# Altium integrated library Wurth Electronik Socket Header 6130xx11821.IntLib: 197 symbols (part 1 of 2) (continued)
## WE-2.54 mm Socket Header 61003221821 (continued)
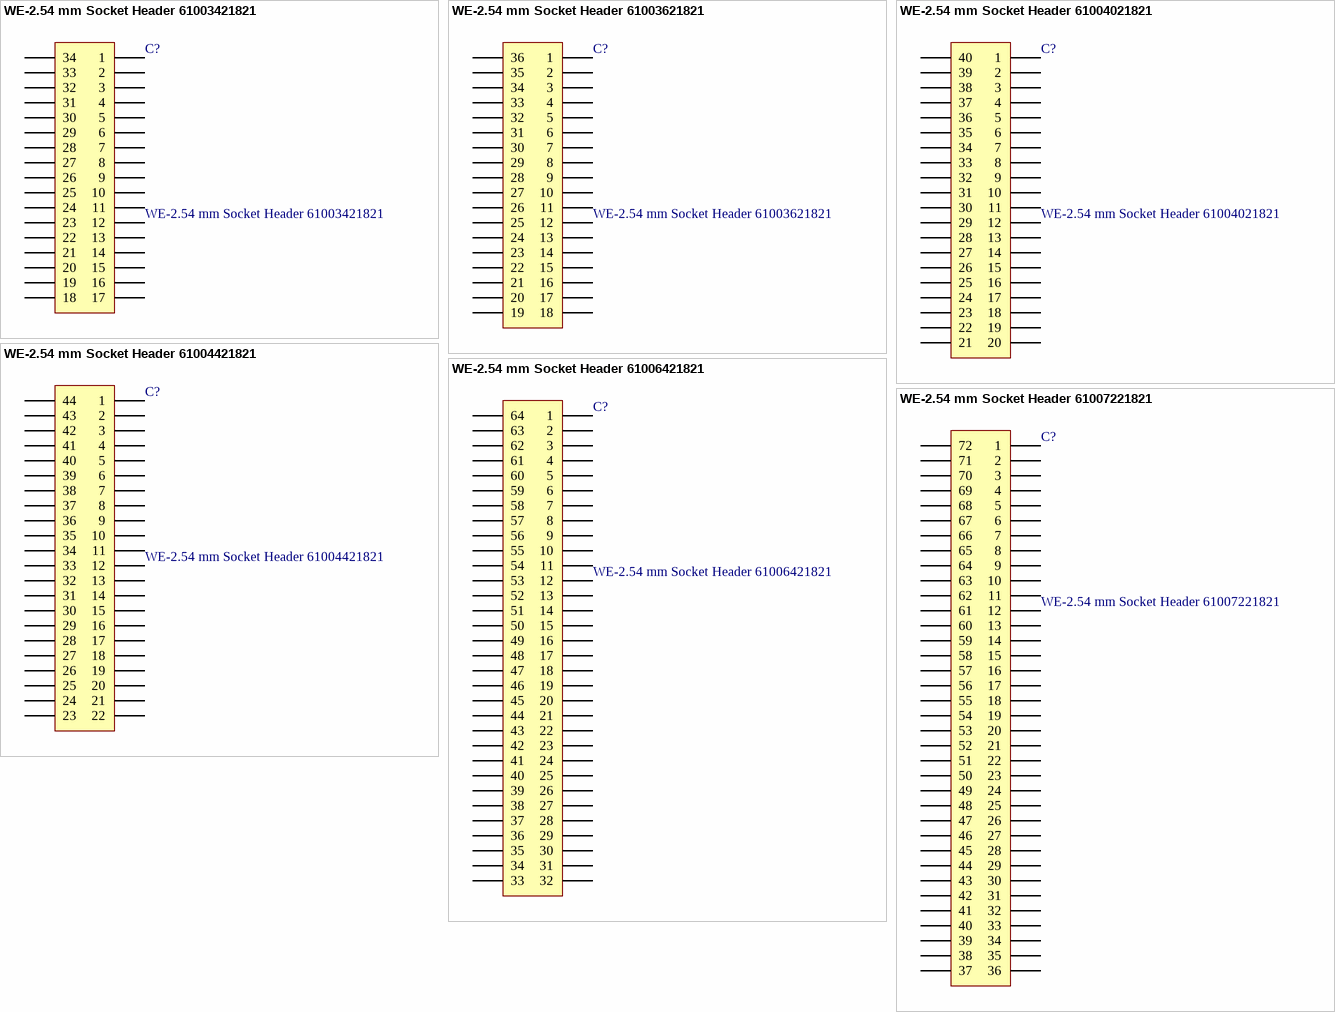
[diagram p2: symbols WE-2.54 mm Socket Header 61003421821 to WE-2.54 mm Socket Header 61007221821]

## WE-2.54 mm Socket Header 61003421821
designator C?
WR-PHD 2.54 mm Dual SMT Socket Header; Manufacturer: Würth Elektronik eiSos GmbH; ComponentLink1 Description: Manufacturer; ComponentLink2 Description: Datasheet; NoPins: 34; Created Date: 29 March 2013; partNo: 61003421821; ComponentLink1URL: http://www.we-online.com; ComponentLink2URL: http://katalog.we-online.de/em/datasheet/6100xx21821.pdf; Created by: Karrer Zheng
footprint 61003421821 (34 pins, dual row, straight, gold plating)
pins: 1, 2, 3, 4, 5, 6, 7, 8, 9, 10, 11, 12, 13, 14, 15, 16, 17, 18, 19, 20, 21, 22, 23, 24, 25, 26, 27, 28, 29, 30, 31, 32, 33, 34

## WE-2.54 mm Socket Header 61003621821
designator C?
WR-PHD 2.54 mm Dual SMT Socket Header; Manufacturer: Würth Elektronik eiSos GmbH; ComponentLink1 Description: Manufacturer; ComponentLink2 Description: Datasheet; NoPins: 36; Created Date: 29 March 2013; partNo: 61003621821; ComponentLink1URL: http://www.we-online.com; ComponentLink2URL: http://katalog.we-online.de/em/datasheet/6100xx21821.pdf; Created by: Karrer Zheng
footprint 61003621821 (36 pins, dual row, straight, gold plating)
pins: 1, 2, 3, 4, 5, 6, 7, 8, 9, 10, 11, 12, 13, 14, 15, 16, 17, 18, 19, 20, 21, 22, 23, 24, 25, 26, 27, 28, 29, 30, 31, 32, 33, 34, 35, 36

## WE-2.54 mm Socket Header 61004021821
designator C?
WR-PHD 2.54 mm Dual SMT Socket Header; Manufacturer: Würth Elektronik eiSos GmbH; ComponentLink1 Description: Manufacturer; ComponentLink2 Description: Datasheet; NoPins: 40; Created Date: 29 March 2013; partNo: 61004021821; ComponentLink1URL: http://www.we-online.com; ComponentLink2URL: http://katalog.we-online.de/em/datasheet/6100xx21821.pdf; Created by: Karrer Zheng
footprint 61004021821 (40 pins, dual row, straight, gold plating)
pins: 1, 2, 3, 4, 5, 6, 7, 8, 9, 10, 11, 12, 13, 14, 15, 16, 17, 18, 19, 20, 21, 22, 23, 24, 25, 26, 27, 28, 29, 30, 31, 32, 33, 34, 35, 36, 37, 38, 39, 40

## WE-2.54 mm Socket Header 61004421821
designator C?
WR-PHD 2.54 mm Dual SMT Socket Header; Manufacturer: Würth Elektronik eiSos GmbH; ComponentLink1 Description: Manufacturer; ComponentLink2 Description: Datasheet; NoPins: 44; Created Date: 29 March 2013; partNo: 61004421821; ComponentLink1URL: http://www.we-online.com; ComponentLink2URL: http://katalog.we-online.de/em/datasheet/6100xx21821.pdf; Created by: Karrer Zheng
footprint 61004421821 (44 pins, dual row, straight, gold plating)
pins: 1, 2, 3, 4, 5, 6, 7, 8, 9, 10, 11, 12, 13, 14, 15, 16, 17, 18, 19, 20, 21, 22, 23, 24, 25, 26, 27, 28, 29, 30, 31, 32, 33, 34, 35, 36, 37, 38, 39, 40, 41, 42, 43, 44

## WE-2.54 mm Socket Header 61006421821
designator C?
WR-PHD 2.54 mm Dual SMT Socket Header; Manufacturer: Würth Elektronik eiSos GmbH; ComponentLink1 Description: Manufacturer; ComponentLink2 Description: Datasheet; NoPins: 64; Created Date: 29 March 2013; partNo: 61006421821; ComponentLink1URL: http://www.we-online.com; ComponentLink2URL: http://katalog.we-online.de/em/datasheet/6100xx21821.pdf; Created by: Karrer Zheng
footprint 61006421821 (64 pins, dual row, straight, gold plating)
pins: 1, 2, 3, 4, 5, 6, 7, 8, 9, 10, 11, 12, 13, 14, 15, 16, 17, 18, 19, 20, 21, 22, 23, 24, 25, 26, 27, 28, 29, 30, 31, 32, 33, 34, 35, 36, 37, 38, 39, 40, 41, 42, 43, 44, 45, 46, 47, 48, 49, 50, 51, 52, 53, 54, 55, 56, 57, 58, 59, 60, 61, 62, 63, 64

## WE-2.54 mm Socket Header 61007221821
designator C?
WR-PHD 2.54 mm Dual SMT Socket Header; Manufacturer: Würth Elektronik eiSos GmbH; ComponentLink1 Description: Manufacturer; ComponentLink2 Description: Datasheet; NoPins: 72; Created Date: 29 March 2013; partNo: 61007221821; ComponentLink1URL: http://www.we-online.com; ComponentLink2URL: http://katalog.we-online.de/em/datasheet/6100xx21821.pdf; Created by: Karrer Zheng
footprint 61007221821 (72 pins, dual row, straight, gold plating)
pins: 1, 2, 3, 4, 5, 6, 7, 8, 9, 10, 11, 12, 13, 14, 15, 16, 17, 18, 19, 20, 21, 22, 23, 24, 25, 26, 27, 28, 29, 30, 31, 32, 33, 34, 35, 36, 37, 38, 39, 40, 41, 42, 43, 44, 45, 46, 47, 48, 49, 50, 51, 52, 53, 54, 55, 56, 57, 58, 59, 60, 61, 62, 63, 64, 65, 66, 67, 68, 69, 70, 71, 72


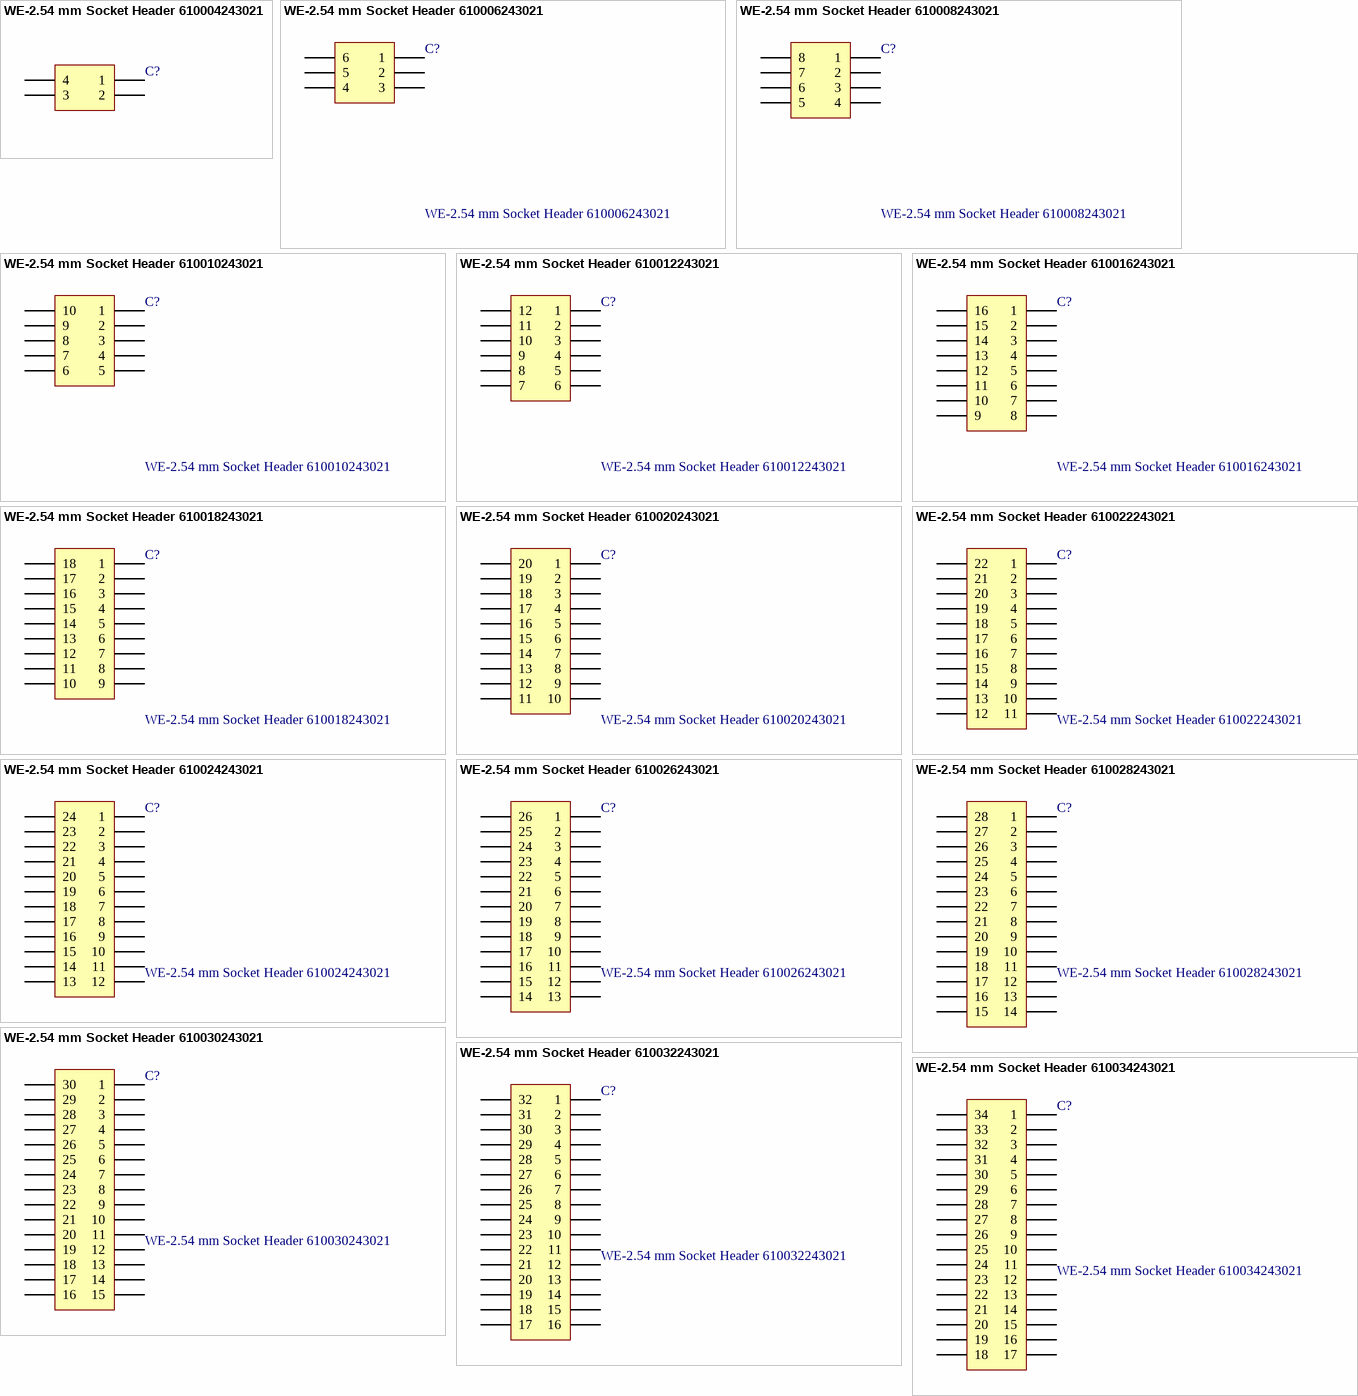
[diagram p3: symbols WE-2.54 mm Socket Header 610004243021 to WE-2.54 mm Socket Header 610034243021]

## WE-2.54 mm Socket Header 610004243021
designator C?
WR-PHD 2.54 mm SMT Dual Socket Header Bottom Entry; Manufacturer: Würth Elektronik eiSos GmbH; ComponentLink1 Description: Manufacturer; ComponentLink2 Description: Datasheet; NoPins: 04; Created Date: 29 March 2013; partNo: 610004243021; ComponentLink1URL: http://www.we-online.com; ComponentLink2URL: http://katalog.we-online.de/em/datasheet/6100xx243021.pdf; Created by: Karrer Zheng
footprint 610004243021 (04p dual row straight 3,7mm height)
pins: 1, 2, 3, 4

## WE-2.54 mm Socket Header 610006243021
designator C?
WR-PHD 2.54 mm SMT Dual Socket Header Bottom Entry; Manufacturer: Würth Elektronik eiSos GmbH; ComponentLink1 Description: Manufacturer; ComponentLink2 Description: Datasheet; NoPins: 06; Created Date: 29 March 2013; partNo: 610006243021; ComponentLink1URL: http://www.we-online.com; ComponentLink2URL: http://katalog.we-online.de/em/datasheet/6100xx243021.pdf; Created by: Karrer Zheng
footprint 610006243021 (06p dual row straight 3,7mm height)
pins: 1, 2, 3, 4, 5, 6

## WE-2.54 mm Socket Header 610008243021
designator C?
WR-PHD 2.54 mm SMT Dual Socket Header Bottom Entry; Manufacturer: Würth Elektronik eiSos GmbH; ComponentLink1 Description: Manufacturer; ComponentLink2 Description: Datasheet; NoPins: 08; Created Date: 29 March 2013; partNo: 610008243021; ComponentLink1URL: http://www.we-online.com; ComponentLink2URL: http://katalog.we-online.de/em/datasheet/6100xx243021.pdf; Created by: Karrer Zheng
footprint 610008243021 (08p dual row straight 3,7mm height)
pins: 1, 2, 3, 4, 5, 6, 7, 8

## WE-2.54 mm Socket Header 610010243021
designator C?
WR-PHD 2.54 mm SMT Dual Socket Header Bottom Entry; Manufacturer: Würth Elektronik eiSos GmbH; ComponentLink1 Description: Manufacturer; ComponentLink2 Description: Datasheet; NoPins: 10; Created Date: 29 March 2013; partNo: 610010243021; ComponentLink1URL: http://www.we-online.com; ComponentLink2URL: http://katalog.we-online.de/em/datasheet/6100xx243021.pdf; Created by: Karrer Zheng
footprint 610010243021 (10p dual row straight 3,7mm height)
pins: 1, 2, 3, 4, 5, 6, 7, 8, 9, 10

## WE-2.54 mm Socket Header 610012243021
designator C?
WR-PHD 2.54 mm SMT Dual Socket Header Bottom Entry; Manufacturer: Würth Elektronik eiSos GmbH; ComponentLink1 Description: Manufacturer; ComponentLink2 Description: Datasheet; NoPins: 12; Created Date: 29 March 2013; partNo: 610012243021; ComponentLink1URL: http://www.we-online.com; ComponentLink2URL: http://katalog.we-online.de/em/datasheet/6100xx243021.pdf; Created by: Karrer Zheng
footprint 610012243021 (12p dual row straight 3,7mm height)
pins: 1, 2, 3, 4, 5, 6, 7, 8, 9, 10, 11, 12

## WE-2.54 mm Socket Header 610016243021
designator C?
WR-PHD 2.54 mm SMT Dual Socket Header Bottom Entry; Manufacturer: Würth Elektronik eiSos GmbH; ComponentLink1 Description: Manufacturer; ComponentLink2 Description: Datasheet; NoPins: 16; Created Date: 29 March 2013; partNo: 610016243021; ComponentLink1URL: http://www.we-online.com; ComponentLink2URL: http://katalog.we-online.de/em/datasheet/6100xx243021.pdf; Created by: Karrer Zheng
footprint 610016243021 (16p dual row straight 3,7mm height)
pins: 1, 2, 3, 4, 5, 6, 7, 8, 9, 10, 11, 12, 13, 14, 15, 16

## WE-2.54 mm Socket Header 610018243021
designator C?
WR-PHD 2.54 mm SMT Dual Socket Header Bottom Entry; Manufacturer: Würth Elektronik eiSos GmbH; ComponentLink1 Description: Manufacturer; ComponentLink2 Description: Datasheet; NoPins: 18; Created Date: 29 March 2013; partNo: 610018243021; ComponentLink1URL: http://www.we-online.com; ComponentLink2URL: http://katalog.we-online.de/em/datasheet/6100xx243021.pdf; Created by: Karrer Zheng
footprint 610018243021 (18p dual row straight 3,7mm height)
pins: 1, 2, 3, 4, 5, 6, 7, 8, 9, 10, 11, 12, 13, 14, 15, 16, 17, 18

## WE-2.54 mm Socket Header 610020243021
designator C?
WR-PHD 2.54 mm SMT Dual Socket Header Bottom Entry; Manufacturer: Würth Elektronik eiSos GmbH; ComponentLink1 Description: Manufacturer; ComponentLink2 Description: Datasheet; NoPins: 20; Created Date: 29 March 2013; partNo: 610020243021; ComponentLink1URL: http://www.we-online.com; ComponentLink2URL: http://katalog.we-online.de/em/datasheet/6100xx243021.pdf; Created by: Karrer Zheng
footprint 610020243021 (20p dual row straight 3,7mm height)
pins: 1, 2, 3, 4, 5, 6, 7, 8, 9, 10, 11, 12, 13, 14, 15, 16, 17, 18, 19, 20

## WE-2.54 mm Socket Header 610022243021
designator C?
WR-PHD 2.54 mm SMT Dual Socket Header Bottom Entry; Manufacturer: Würth Elektronik eiSos GmbH; ComponentLink1 Description: Manufacturer; ComponentLink2 Description: Datasheet; NoPins: 22; Created Date: 29 March 2013; partNo: 610022243021; ComponentLink1URL: http://www.we-online.com; ComponentLink2URL: http://katalog.we-online.de/em/datasheet/6100xx243021.pdf; Created by: Karrer Zheng
footprint 610022243021 (22p dual row straight 3,7mm height)
pins: 1, 2, 3, 4, 5, 6, 7, 8, 9, 10, 11, 12, 13, 14, 15, 16, 17, 18, 19, 20, 21, 22

## WE-2.54 mm Socket Header 610024243021
designator C?
WR-PHD 2.54 mm SMT Dual Socket Header Bottom Entry; Manufacturer: Würth Elektronik eiSos GmbH; ComponentLink1 Description: Manufacturer; ComponentLink2 Description: Datasheet; NoPins: 24; Created Date: 29 March 2013; partNo: 610024243021; ComponentLink1URL: http://www.we-online.com; ComponentLink2URL: http://katalog.we-online.de/em/datasheet/6100xx243021.pdf; Created by: Karrer Zheng
footprint 610024243021 (24p dual row straight 3,7mm height)
pins: 1, 2, 3, 4, 5, 6, 7, 8, 9, 10, 11, 12, 13, 14, 15, 16, 17, 18, 19, 20, 21, 22, 23, 24

## WE-2.54 mm Socket Header 610026243021
designator C?
WR-PHD 2.54 mm SMT Dual Socket Header Bottom Entry; Manufacturer: Würth Elektronik eiSos GmbH; ComponentLink1 Description: Manufacturer; ComponentLink2 Description: Datasheet; NoPins: 26; Created Date: 29 March 2013; partNo: 610026243021; ComponentLink1URL: http://www.we-online.com; ComponentLink2URL: http://katalog.we-online.de/em/datasheet/6100xx243021.pdf; Created by: Karrer Zheng
footprint 610026243021 (26p dual row straight 3,7mm height)
pins: 1, 2, 3, 4, 5, 6, 7, 8, 9, 10, 11, 12, 13, 14, 15, 16, 17, 18, 19, 20, 21, 22, 23, 24, 25, 26

## WE-2.54 mm Socket Header 610028243021
designator C?
WR-PHD 2.54 mm SMT Dual Socket Header Bottom Entry; Manufacturer: Würth Elektronik eiSos GmbH; ComponentLink1 Description: Manufacturer; ComponentLink2 Description: Datasheet; NoPins: 28; Created Date: 29 March 2013; partNo: 610028243021; ComponentLink1URL: http://www.we-online.com; ComponentLink2URL: http://katalog.we-online.de/em/datasheet/6100xx243021.pdf; Created by: Karrer Zheng
footprint 610028243021 (28p dual row straight 3,7mm height)
pins: 1, 2, 3, 4, 5, 6, 7, 8, 9, 10, 11, 12, 13, 14, 15, 16, 17, 18, 19, 20, 21, 22, 23, 24, 25, 26, 27, 28

## WE-2.54 mm Socket Header 610030243021
designator C?
WR-PHD 2.54 mm SMT Dual Socket Header Bottom Entry; Manufacturer: Würth Elektronik eiSos GmbH; ComponentLink1 Description: Manufacturer; ComponentLink2 Description: Datasheet; NoPins: 30; Created Date: 29 March 2013; partNo: 610030243021; ComponentLink1URL: http://www.we-online.com; ComponentLink2URL: http://katalog.we-online.de/em/datasheet/6100xx243021.pdf; Created by: Karrer Zheng
footprint 610030243021 (30p dual row straight 3,7mm height)
pins: 1, 2, 3, 4, 5, 6, 7, 8, 9, 10, 11, 12, 13, 14, 15, 16, 17, 18, 19, 20, 21, 22, 23, 24, 25, 26, 27, 28, 29, 30

## WE-2.54 mm Socket Header 610032243021
designator C?
WR-PHD 2.54 mm SMT Dual Socket Header Bottom Entry; Manufacturer: Würth Elektronik eiSos GmbH; ComponentLink1 Description: Manufacturer; ComponentLink2 Description: Datasheet; NoPins: 32; Created Date: 29 March 2013; partNo: 610032243021; ComponentLink1URL: http://www.we-online.com; ComponentLink2URL: http://katalog.we-online.de/em/datasheet/6100xx243021.pdf; Created by: Karrer Zheng
footprint 610032243021 (32p dual row straight 3,7mm height)
pins: 1, 2, 3, 4, 5, 6, 7, 8, 9, 10, 11, 12, 13, 14, 15, 16, 17, 18, 19, 20, 21, 22, 23, 24, 25, 26, 27, 28, 29, 30, 31, 32

## WE-2.54 mm Socket Header 610034243021
designator C?
WR-PHD 2.54 mm SMT Dual Socket Header Bottom Entry; Manufacturer: Würth Elektronik eiSos GmbH; ComponentLink1 Description: Manufacturer; ComponentLink2 Description: Datasheet; NoPins: 34; Created Date: 29 March 2013; partNo: 610034243021; ComponentLink1URL: http://www.we-online.com; ComponentLink2URL: http://katalog.we-online.de/em/datasheet/6100xx243021.pdf; Created by: Karrer Zheng
footprint 610034243021 (34p dual row straight 3,7mm height)
pins: 1, 2, 3, 4, 5, 6, 7, 8, 9, 10, 11, 12, 13, 14, 15, 16, 17, 18, 19, 20, 21, 22, 23, 24, 25, 26, 27, 28, 29, 30, 31, 32, 33, 34

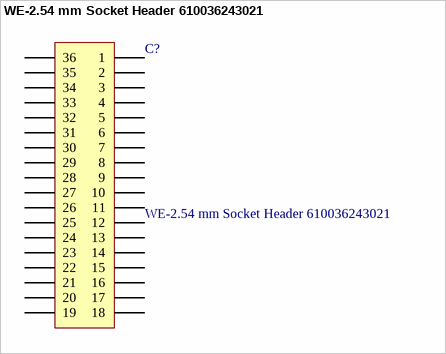
[diagram p4: symbol WE-2.54 mm Socket Header 610036243021]

## WE-2.54 mm Socket Header 610036243021
designator C?
WR-PHD 2.54 mm SMT Dual Socket Header Bottom Entry; Manufacturer: Würth Elektronik eiSos GmbH; ComponentLink1 Description: Manufacturer; ComponentLink2 Description: Datasheet; NoPins: 36; Created Date: 29 March 2013; partNo: 610036243021; ComponentLink1URL: http://www.we-online.com; ComponentLink2URL: http://katalog.we-online.de/em/datasheet/6100xx243021.pdf; Created by: Karrer Zheng
footprint 610036243021 (36p dual row straight 3,7mm height)
pins: 1, 2, 3, 4, 5, 6, 7, 8, 9, 10, 11, 12, 13, 14, 15, 16, 17, 18, 19, 20, 21, 22, 23, 24, 25, 26, 27, 28, 29, 30, 31, 32, 33, 34, 35, 36


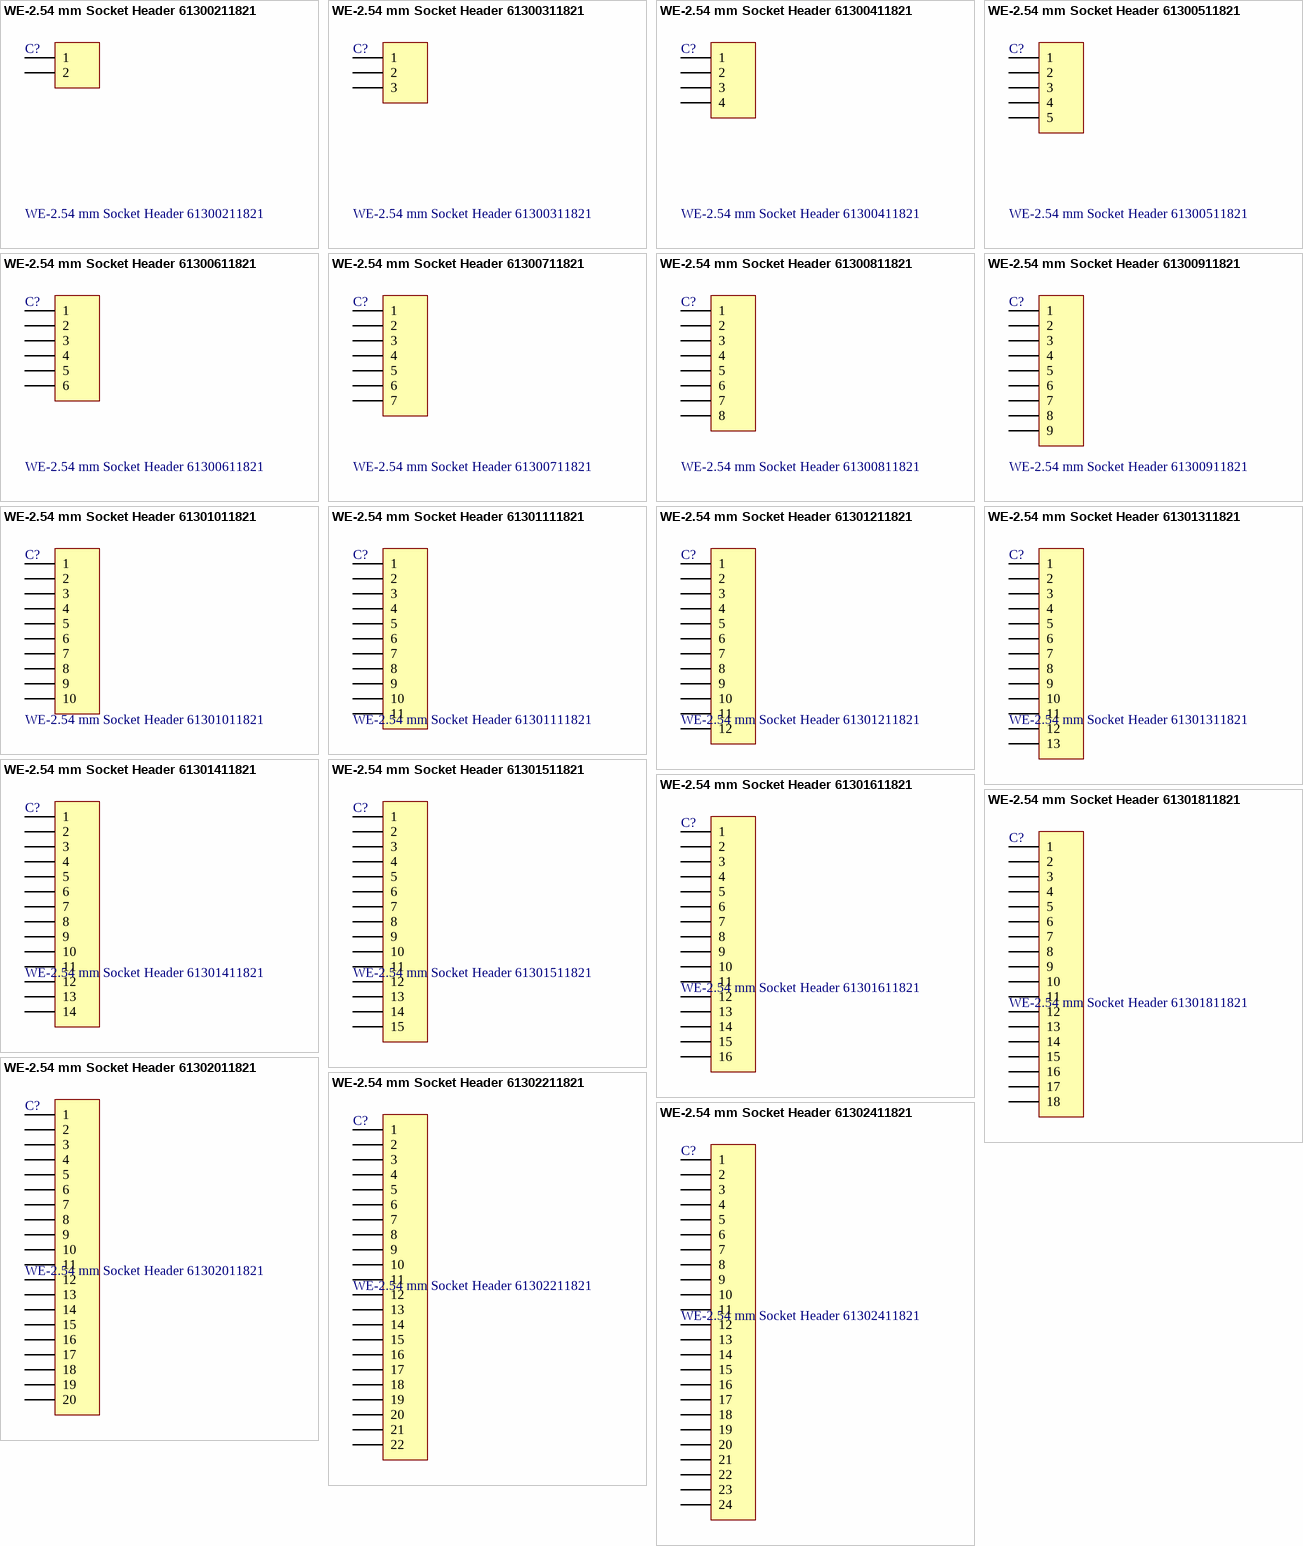
[diagram p5: symbols WE-2.54 mm Socket Header 61300211821 to WE-2.54 mm Socket Header 61302411821]

## WE-2.54 mm Socket Header 61300211821
designator C?
WR-PHD 2.54 mm Socket Header; Manufacturer: Würth Elektronik eiSos GmbH; ComponentLink1 Description: Manufacturer; ComponentLink2 Description: Datasheet; NoPins: 02; Created Date: 29 March 2013; partNo: 61300211821; ComponentLink1URL: http://www.we-online.com; ComponentLink2URL: http://katalog.we-online.de/em/datasheet/6130xx11821.pdf; Created by: Karrer Zheng
footprint 61300211821 (2 row, straight, gold plating)
pins: 1, 2

## WE-2.54 mm Socket Header 61300311821
designator C?
WR-PHD 2.54 mm Socket Header; Manufacturer: Würth Elektronik eiSos GmbH; ComponentLink1 Description: Manufacturer; ComponentLink2 Description: Datasheet; NoPins: 03; Created Date: 29 March 2013; partNo: 61300311821; ComponentLink1URL: http://www.we-online.com; ComponentLink2URL: http://katalog.we-online.de/em/datasheet/6130xx11821.pdf; Created by: Karrer Zheng
footprint 61300311821 (3 row, straight, gold plating)
pins: 1, 2, 3

## WE-2.54 mm Socket Header 61300411821
designator C?
WR-PHD 2.54 mm Socket Header; Manufacturer: Würth Elektronik eiSos GmbH; ComponentLink1 Description: Manufacturer; ComponentLink2 Description: Datasheet; NoPins: 04; Created Date: 29 March 2013; partNo: 61300411821; ComponentLink1URL: http://www.we-online.com; ComponentLink2URL: http://katalog.we-online.de/em/datasheet/6130xx11821.pdf; Created by: Karrer Zheng
footprint 61300411821 (4 row, straight, gold plating)
pins: 1, 2, 3, 4

## WE-2.54 mm Socket Header 61300511821
designator C?
WR-PHD 2.54 mm Socket Header; Manufacturer: Würth Elektronik eiSos GmbH; ComponentLink1 Description: Manufacturer; ComponentLink2 Description: Datasheet; NoPins: 05; Created Date: 29 March 2013; partNo: 61300511821; ComponentLink1URL: http://www.we-online.com; ComponentLink2URL: http://katalog.we-online.de/em/datasheet/6130xx11821.pdf; Created by: Karrer Zheng
footprint 61300511821 (5 row, straight, gold plating)
pins: 1, 2, 3, 4, 5

## WE-2.54 mm Socket Header 61300611821
designator C?
WR-PHD 2.54 mm Socket Header; Manufacturer: Würth Elektronik eiSos GmbH; ComponentLink1 Description: Manufacturer; ComponentLink2 Description: Datasheet; NoPins: 06; Created Date: 29 March 2013; partNo: 61300611821; ComponentLink1URL: http://www.we-online.com; ComponentLink2URL: http://katalog.we-online.de/em/datasheet/6130xx11821.pdf; Created by: Karrer Zheng
footprint 61300611821 (6 row, straight, gold plating)
pins: 1, 2, 3, 4, 5, 6

## WE-2.54 mm Socket Header 61300711821
designator C?
WR-PHD 2.54 mm Socket Header; Manufacturer: Würth Elektronik eiSos GmbH; ComponentLink1 Description: Manufacturer; ComponentLink2 Description: Datasheet; NoPins: 07; Created Date: 29 March 2013; partNo: 61300711821; ComponentLink1URL: http://www.we-online.com; ComponentLink2URL: http://katalog.we-online.de/em/datasheet/6130xx11821.pdf; Created by: Karrer Zheng
footprint 61300711821 (7 row, straight, gold plating)
pins: 1, 2, 3, 4, 5, 6, 7

## WE-2.54 mm Socket Header 61300811821
designator C?
WR-PHD 2.54 mm Socket Header; Manufacturer: Würth Elektronik eiSos GmbH; ComponentLink1 Description: Manufacturer; ComponentLink2 Description: Datasheet; NoPins: 08; Created Date: 29 March 2013; partNo: 61300811821; ComponentLink1URL: http://www.we-online.com; ComponentLink2URL: http://katalog.we-online.de/em/datasheet/6130xx11821.pdf; Created by: Karrer Zheng
footprint 61300811821 (8 row, straight, gold plating)
pins: 1, 2, 3, 4, 5, 6, 7, 8

## WE-2.54 mm Socket Header 61300911821
designator C?
WR-PHD 2.54 mm Socket Header; Manufacturer: Würth Elektronik eiSos GmbH; ComponentLink1 Description: Manufacturer; ComponentLink2 Description: Datasheet; NoPins: 09; Created Date: 29 March 2013; partNo: 61300911821; ComponentLink1URL: http://www.we-online.com; ComponentLink2URL: http://katalog.we-online.de/em/datasheet/6130xx11821.pdf; Created by: Karrer Zheng
footprint 61300911821 (9 row, straight, gold plating)
pins: 1, 2, 3, 4, 5, 6, 7, 8, 9

## WE-2.54 mm Socket Header 61301011821
designator C?
WR-PHD 2.54 mm Socket Header; Manufacturer: Würth Elektronik eiSos GmbH; ComponentLink1 Description: Manufacturer; ComponentLink2 Description: Datasheet; NoPins: 10; Created Date: 29 March 2013; partNo: 61301011821; ComponentLink1URL: http://www.we-online.com; ComponentLink2URL: http://katalog.we-online.de/em/datasheet/6130xx11821.pdf; Created by: Karrer Zheng
footprint 61301011821 (10 row, straight, gold plating)
pins: 1, 2, 3, 4, 5, 6, 7, 8, 9, 10

## WE-2.54 mm Socket Header 61301111821
designator C?
WR-PHD 2.54 mm Socket Header; Manufacturer: Würth Elektronik eiSos GmbH; ComponentLink1 Description: Manufacturer; ComponentLink2 Description: Datasheet; NoPins: 11; Created Date: 29 March 2013; partNo: 61301111821; ComponentLink1URL: http://www.we-online.com; ComponentLink2URL: http://katalog.we-online.de/em/datasheet/6130xx11821.pdf; Created by: Karrer Zheng
footprint 61301111821 (11 row, straight, gold plating)
pins: 1, 2, 3, 4, 5, 6, 7, 8, 9, 10, 11
